# Altium footprint library con-samtec.PCBLIB: 805 footprints (part 16 of 55)
Each footprint in its own frame and in the unit in brackets; x right, y up, seen from the top. Pads: shape width x height; smd on the part's side, far side on the other; paste and mask are expansions set on the pad; w line width, h text height; cw(c..) or ccw(c..) is an arc to the next point about the centre after c.
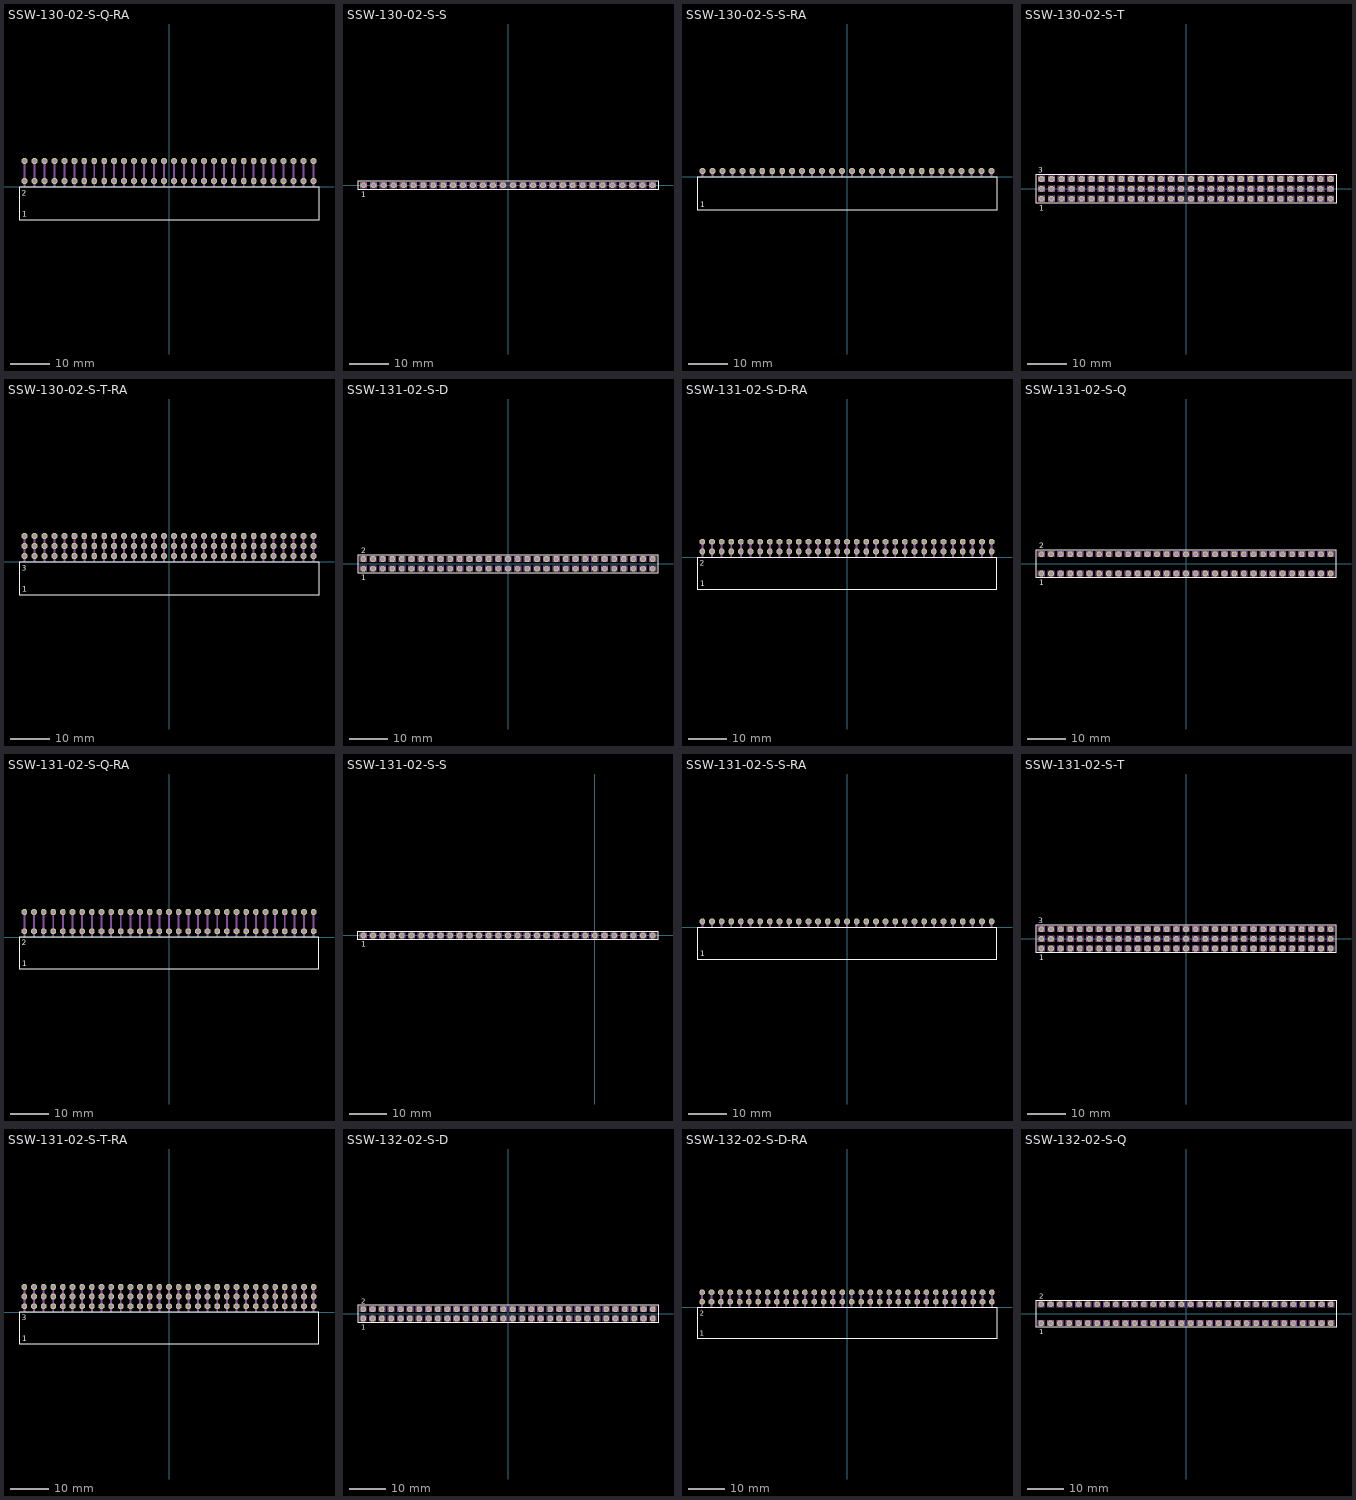
[diagram p15: the footprints below, top view; thin cyan lines are the x and y axes]

## SSW-130-02-S-Q-RA [mil]
pads (60):
  oct 59.06x59.06 hole 39.37: 1(-1450,60) 2(-1450,260) 3(-1350,60) 4(-1350,260) 5(-1250,60) 6(-1250,260) 7(-1150,60) 8(-1150,260) 9(-1050,60) 10(-1050,260) 11(-950,60) 12(-950,260) 13(-850,60) 14(-850,260) 15(-750,60) 16(-750,260) 17(-650,60) 18(-650,260) 19(-550,60) 20(-550,260) 21(-450,60) 22(-450,260) 23(-350,60) 24(-350,260) 25(-250,60) 26(-250,260) 27(-150,60) 28(-150,260) 29(-50,60) 30(-50,260) 31(50,60) 32(50,260) 33(150,60) 34(150,260) 35(250,60) 36(250,260) 37(350,60) 38(350,260) 39(450,60) 40(450,260) 41(550,60) 42(550,260) 43(650,60) 44(650,260) 45(750,60) 46(750,260) 47(850,60) 48(850,260) 49(950,60) 50(950,260) 51(1050,60) 52(1050,260) 53(1150,60) 54(1150,260) 55(1250,60) 56(1250,260) 57(1350,60) 58(1350,260) 59(1450,60) 60(1450,260)
Top Overlay:
  lines w8: -1505.08,-330.55 1505.08,-330.55 1505.08,-4.17 -1505.08,-4.17 -1505.08,-330.55
  text "1" at -1473.43,-301.18 h56.1
  text "2" at -1476.38,-86.61 h56.1
Mechanical 16:
  rectangle: -1460,0 -1440,270
  rectangle: -1360,0 -1340,270
  rectangle: -1260,0 -1240,270
  rectangle: -1160,0 -1140,270
  rectangle: -1060,0 -1040,270
  rectangle: -960,0 -940,270
  rectangle: -860,0 -840,270
  rectangle: -760,0 -740,270
  rectangle: -660,0 -640,270
  rectangle: -560,0 -540,270
  rectangle: -460,0 -440,270
  rectangle: -360,0 -340,270
  rectangle: -260,0 -240,270
  rectangle: -160,0 -140,270
  rectangle: -60,0 -40,270
  rectangle: 40,0 60,270
  rectangle: 140,0 160,270
  rectangle: 240,0 260,270
  rectangle: 340,0 360,270
  rectangle: 440,0 460,270
  rectangle: 540,0 560,270
  rectangle: 640,0 660,270
  rectangle: 740,0 760,270
  rectangle: 840,0 860,270
  rectangle: 940,0 960,270
  rectangle: 1040,0 1060,270
  rectangle: 1140,0 1160,270
  rectangle: 1240,0 1260,270
  rectangle: 1340,0 1360,270
  rectangle: 1440,0 1460,270

## SSW-130-02-S-S [mm]
pads (30):
  oct 1.5x1.5 hole 1: 1(-36.83,0) 2(-34.29,0) 3(-31.75,0) 4(-29.21,0) 5(-26.67,0) 6(-24.13,0) 7(-21.59,0) 8(-19.05,0) 9(-16.51,0) 10(-13.97,0) 11(-11.43,0) 12(-8.89,0) 13(-6.35,0) 14(-3.81,0) 15(-1.27,0) 16(1.27,0) 17(3.81,0) 18(6.35,0) 19(8.89,0) 20(11.43,0) 21(13.97,0) 22(16.51,0) 23(19.05,0) 24(21.59,0) 25(24.13,0) 26(26.67,0) 27(29.21,0) 28(31.75,0) 29(34.29,0) 30(36.83,0)
Top Overlay:
  lines w0.203: -38.229,-1.155 38.229,-1.155 38.229,1.155 -38.229,1.155 -38.229,-1.155
  text "1" at -37.338,-3.048 h1.42
Mechanical 16:
  lines w0.203: -37.575,-0.745 -36.075,-0.745 -36.075,0.755 -37.575,0.755 -37.575,-0.745 ; -35.035,-0.745 -33.535,-0.745 -33.535,0.755 -35.035,0.755 -35.035,-0.745 ; -32.495,-0.745 -30.995,-0.745 -30.995,0.755 -32.495,0.755 -32.495,-0.745 ; -29.955,-0.745 -28.455,-0.745 -28.455,0.755 -29.955,0.755 -29.955,-0.745 ; -27.415,-0.745 -25.915,-0.745 -25.915,0.755 -27.415,0.755 -27.415,-0.745 ; -24.875,-0.745 -23.375,-0.745 -23.375,0.755 -24.875,0.755 -24.875,-0.745 ; -22.335,-0.745 -20.835,-0.745 -20.835,0.755 -22.335,0.755 -22.335,-0.745 ; -19.795,-0.745 -18.295,-0.745 -18.295,0.755 -19.795,0.755 -19.795,-0.745 ; -17.255,-0.745 -15.755,-0.745 -15.755,0.755 -17.255,0.755 -17.255,-0.745 ; -14.715,-0.745 -13.215,-0.745 -13.215,0.755 -14.715,0.755 -14.715,-0.745 ; -12.175,-0.745 -10.675,-0.745 -10.675,0.755 -12.175,0.755 -12.175,-0.745 ; -9.635,-0.745 -8.135,-0.745 -8.135,0.755 -9.635,0.755 -9.635,-0.745 ; -7.095,-0.745 -5.595,-0.745 -5.595,0.755 -7.095,0.755 -7.095,-0.745 ; -4.555,-0.745 -3.055,-0.745 -3.055,0.755 -4.555,0.755 -4.555,-0.745 ; -2.015,-0.745 -0.515,-0.745 -0.515,0.755 -2.015,0.755 -2.015,-0.745 ; 0.525,-0.745 2.025,-0.745 2.025,0.755 0.525,0.755 0.525,-0.745 ; 3.065,-0.745 4.565,-0.745 4.565,0.755 3.065,0.755 3.065,-0.745 ; 5.605,-0.745 7.105,-0.745 7.105,0.755 5.605,0.755 5.605,-0.745 ; 8.145,-0.745 9.645,-0.745 9.645,0.755 8.145,0.755 8.145,-0.745 ; 10.685,-0.745 12.185,-0.745 12.185,0.755 10.685,0.755 10.685,-0.745 ; 13.225,-0.745 14.725,-0.745 14.725,0.755 13.225,0.755 13.225,-0.745 ; 15.765,-0.745 17.265,-0.745 17.265,0.755 15.765,0.755 15.765,-0.745 ; 18.305,-0.745 19.805,-0.745 19.805,0.755 18.305,0.755 18.305,-0.745 ; 20.845,-0.745 22.345,-0.745 22.345,0.755 20.845,0.755 20.845,-0.745 ; 23.385,-0.745 24.885,-0.745 24.885,0.755 23.385,0.755 23.385,-0.745 ; 25.925,-0.745 27.425,-0.745 27.425,0.755 25.925,0.755 25.925,-0.745 ; 28.465,-0.745 29.965,-0.745 29.965,0.755 28.465,0.755 28.465,-0.745 ; 31.005,-0.745 32.505,-0.745 32.505,0.755 31.005,0.755 31.005,-0.745 ; 33.545,-0.745 35.045,-0.745 35.045,0.755 33.545,0.755 33.545,-0.745 ; 36.085,-0.745 37.585,-0.745 37.585,0.755 36.085,0.755 36.085,-0.745

## SSW-130-02-S-S-RA [mil]
pads (30):
  oct 59.06x59.06 hole 39.37: 1(-1450,60) 2(-1350,60) 3(-1250,60) 4(-1150,60) 5(-1050,60) 6(-950,60) 7(-850,60) 8(-750,60) 9(-650,60) 10(-550,60) 11(-450,60) 12(-350,60) 13(-250,60) 14(-150,60) 15(-50,60) 16(50,60) 17(150,60) 18(250,60) 19(350,60) 20(450,60) 21(550,60) 22(650,60) 23(750,60) 24(850,60) 25(950,60) 26(1050,60) 27(1150,60) 28(1250,60) 29(1350,60) 30(1450,60)
Top Overlay:
  lines w8: -1505.08,-330.55 1505.08,-330.55 1505.08,-4.17 -1505.08,-4.17 -1505.08,-330.55
  text "1" at -1473.43,-301.18 h56.1
Mechanical 16:
  rectangle: -1460,0 -1440,70
  rectangle: -1360,0 -1340,70
  rectangle: -1260,0 -1240,70
  rectangle: -1160,0 -1140,70
  rectangle: -1060,0 -1040,70
  rectangle: -960,0 -940,70
  rectangle: -860,0 -840,70
  rectangle: -760,0 -740,70
  rectangle: -660,0 -640,70
  rectangle: -560,0 -540,70
  rectangle: -460,0 -440,70
  rectangle: -360,0 -340,70
  rectangle: -260,0 -240,70
  rectangle: -160,0 -140,70
  rectangle: -60,0 -40,70
  rectangle: 40,0 60,70
  rectangle: 140,0 160,70
  rectangle: 240,0 260,70
  rectangle: 340,0 360,70
  rectangle: 440,0 460,70
  rectangle: 540,0 560,70
  rectangle: 640,0 660,70
  rectangle: 740,0 760,70
  rectangle: 840,0 860,70
  rectangle: 940,0 960,70
  rectangle: 1040,0 1060,70
  rectangle: 1140,0 1160,70
  rectangle: 1240,0 1260,70
  rectangle: 1340,0 1360,70
  rectangle: 1440,0 1460,70

## SSW-130-02-S-T [mm]
pads (90):
  oct 1.5x1.5 hole 1: 1(-36.83,-2.54) 2(-36.83,0) 3(-36.83,2.54) 4(-34.29,-2.54) 5(-34.29,0) 6(-34.29,2.54) 7(-31.75,-2.54) 8(-31.75,0) 9(-31.75,2.54) 10(-29.21,-2.54) 11(-29.21,0) 12(-29.21,2.54) 13(-26.67,-2.54) 14(-26.67,0) 15(-26.67,2.54) 16(-24.13,-2.54) 17(-24.13,0) 18(-24.13,2.54) 19(-21.59,-2.54) 20(-21.59,0) 21(-21.59,2.54) 22(-19.05,-2.54) 23(-19.05,0) 24(-19.05,2.54) 25(-16.51,-2.54) 26(-16.51,0) 27(-16.51,2.54) 28(-13.97,-2.54) 29(-13.97,0) 30(-13.97,2.54) 31(-11.43,-2.54) 32(-11.43,0) 33(-11.43,2.54) 34(-8.89,-2.54) 35(-8.89,0) 36(-8.89,2.54) 37(-6.35,-2.54) 38(-6.35,0) 39(-6.35,2.54) 40(-3.81,-2.54) 41(-3.81,0) 42(-3.81,2.54) 43(-1.27,-2.54) 44(-1.27,0) 45(-1.27,2.54) 46(1.27,-2.54) 47(1.27,0) 48(1.27,2.54) 49(3.81,-2.54) 50(3.81,0) 51(3.81,2.54) 52(6.35,-2.54) 53(6.35,0) 54(6.35,2.54) 55(8.89,-2.54) 56(8.89,0) 57(8.89,2.54) 58(11.43,-2.54) 59(11.43,0) 60(11.43,2.54) 61(13.97,-2.54) 62(13.97,0) 63(13.97,2.54) 64(16.51,-2.54) 65(16.51,0) 66(16.51,2.54) 67(19.05,-2.54) 68(19.05,0) 69(19.05,2.54) 70(21.59,-2.54) 71(21.59,0) 72(21.59,2.54) 73(24.13,-2.54) 74(24.13,0) 75(24.13,2.54) 76(26.67,-2.54) 77(26.67,0) 78(26.67,2.54) 79(29.21,-2.54) 80(29.21,0) 81(29.21,2.54) 82(31.75,-2.54) 83(31.75,0) 84(31.75,2.54) 85(34.29,-2.54) 86(34.29,0) 87(34.29,2.54) 88(36.83,-2.54) 89(36.83,0) 90(36.83,2.54)
Top Overlay:
  lines w0.203: -38.229,-3.695 38.229,-3.695 38.229,3.695 -38.229,3.695 -38.229,-3.695
  text "1" at -37.338,-5.588 h1.42
  text "3" at -37.592,4.064 h1.42
Mechanical 16:
  drawing of 360 lines, arcs and shapes, not listed

## SSW-130-02-S-T-RA [mil]
pads (90):
  oct 59.06x59.06 hole 39.37: 1(-1450,60) 2(-1450,160) 3(-1450,260) 4(-1350,60) 5(-1350,160) 6(-1350,260) 7(-1250,60) 8(-1250,160) 9(-1250,260) 10(-1150,60) 11(-1150,160) 12(-1150,260) 13(-1050,60) 14(-1050,160) 15(-1050,260) 16(-950,60) 17(-950,160) 18(-950,260) 19(-850,60) 20(-850,160) 21(-850,260) 22(-750,60) 23(-750,160) 24(-750,260) 25(-650,60) 26(-650,160) 27(-650,260) 28(-550,60) 29(-550,160) 30(-550,260) 31(-450,60) 32(-450,160) 33(-450,260) 34(-350,60) 35(-350,160) 36(-350,260) 37(-250,60) 38(-250,160) 39(-250,260) 40(-150,60) 41(-150,160) 42(-150,260) 43(-50,60) 44(-50,160) 45(-50,260) 46(50,60) 47(50,160) 48(50,260) 49(150,60) 50(150,160) 51(150,260) 52(250,60) 53(250,160) 54(250,260) 55(350,60) 56(350,160) 57(350,260) 58(450,60) 59(450,160) 60(450,260) 61(550,60) 62(550,160) 63(550,260) 64(650,60) 65(650,160) 66(650,260) 67(750,60) 68(750,160) 69(750,260) 70(850,60) 71(850,160) 72(850,260) 73(950,60) 74(950,160) 75(950,260) 76(1050,60) 77(1050,160) 78(1050,260) 79(1150,60) 80(1150,160) 81(1150,260) 82(1250,60) 83(1250,160) 84(1250,260) 85(1350,60) 86(1350,160) 87(1350,260) 88(1450,60) 89(1450,160) 90(1450,260)
Top Overlay:
  lines w8: -1505.08,-330.55 1505.08,-330.55 1505.08,-4.17 -1505.08,-4.17 -1505.08,-330.55
  text "1" at -1473.43,-301.18 h56.1
  text "3" at -1476.38,-86.61 h56.1
Mechanical 16:
  rectangle: -1460,0 -1440,270
  rectangle: -1360,0 -1340,270
  rectangle: -1260,0 -1240,270
  rectangle: -1160,0 -1140,270
  rectangle: -1060,0 -1040,270
  rectangle: -960,0 -940,270
  rectangle: -860,0 -840,270
  rectangle: -760,0 -740,270
  rectangle: -660,0 -640,270
  rectangle: -560,0 -540,270
  rectangle: -460,0 -440,270
  rectangle: -360,0 -340,270
  rectangle: -260,0 -240,270
  rectangle: -160,0 -140,270
  rectangle: -60,0 -40,270
  rectangle: 40,0 60,270
  rectangle: 140,0 160,270
  rectangle: 240,0 260,270
  rectangle: 340,0 360,270
  rectangle: 440,0 460,270
  rectangle: 540,0 560,270
  rectangle: 640,0 660,270
  rectangle: 740,0 760,270
  rectangle: 840,0 860,270
  rectangle: 940,0 960,270
  rectangle: 1040,0 1060,270
  rectangle: 1140,0 1160,270
  rectangle: 1240,0 1260,270
  rectangle: 1340,0 1360,270
  rectangle: 1440,0 1460,270

## SSW-131-02-S-D [mm]
pads (62):
  oct 1.5x1.5 hole 1: 1(-38.1,-1.27) 2(-38.1,1.27) 3(-35.56,-1.27) 4(-35.56,1.27) 5(-33.02,-1.27) 6(-33.02,1.27) 7(-30.48,-1.27) 8(-30.48,1.27) 9(-27.94,-1.27) 10(-27.94,1.27) 11(-25.4,-1.27) 12(-25.4,1.27) 13(-22.86,-1.27) 14(-22.86,1.27) 15(-20.32,-1.27) 16(-20.32,1.27) 17(-17.78,-1.27) 18(-17.78,1.27) 19(-15.24,-1.27) 20(-15.24,1.27) 21(-12.7,-1.27) 22(-12.7,1.27) 23(-10.16,-1.27) 24(-10.16,1.27) 25(-7.62,-1.27) 26(-7.62,1.27) 27(-5.08,-1.27) 28(-5.08,1.27) 29(-2.54,-1.27) 30(-2.54,1.27) 31(0,-1.27) 32(0,1.27) 33(2.54,-1.27) 34(2.54,1.27) 35(5.08,-1.27) 36(5.08,1.27) 37(7.62,-1.27) 38(7.62,1.27) 39(10.16,-1.27) 40(10.16,1.27) 41(12.7,-1.27) 42(12.7,1.27) 43(15.24,-1.27) 44(15.24,1.27) 45(17.78,-1.27) 46(17.78,1.27) 47(20.32,-1.27) 48(20.32,1.27) 49(22.86,-1.27) 50(22.86,1.27) 51(25.4,-1.27) 52(25.4,1.27) 53(27.94,-1.27) 54(27.94,1.27) 55(30.48,-1.27) 56(30.48,1.27) 57(33.02,-1.27) 58(33.02,1.27) 59(35.56,-1.27) 60(35.56,1.27) 61(38.1,-1.27) 62(38.1,1.27)
Top Overlay:
  lines w0.203: -39.499,-2.425 39.499,-2.425 39.499,2.425 -39.499,2.425 -39.499,-2.425
  text "1" at -38.608,-4.318 h1.42
  text "2" at -38.608,2.794 h1.42
Mechanical 16:
  drawing of 248 lines, arcs and shapes, not listed

## SSW-131-02-S-D-RA [mil]
pads (62):
  oct 59.06x59.06 hole 39.37: 1(-1500,60) 2(-1500,160) 3(-1400,60) 4(-1400,160) 5(-1300,60) 6(-1300,160) 7(-1200,60) 8(-1200,160) 9(-1100,60) 10(-1100,160) 11(-1000,60) 12(-1000,160) 13(-900,60) 14(-900,160) 15(-800,60) 16(-800,160) 17(-700,60) 18(-700,160) 19(-600,60) 20(-600,160) 21(-500,60) 22(-500,160) 23(-400,60) 24(-400,160) 25(-300,60) 26(-300,160) 27(-200,60) 28(-200,160) 29(-100,60) 30(-100,160) 31(0,60) 32(0,160) 33(100,60) 34(100,160) 35(200,60) 36(200,160) 37(300,60) 38(300,160) 39(400,60) 40(400,160) 41(500,60) 42(500,160) 43(600,60) 44(600,160) 45(700,60) 46(700,160) 47(800,60) 48(800,160) 49(900,60) 50(900,160) 51(1000,60) 52(1000,160) 53(1100,60) 54(1100,160) 55(1200,60) 56(1200,160) 57(1300,60) 58(1300,160) 59(1400,60) 60(1400,160) 61(1500,60) 62(1500,160)
Top Overlay:
  lines w8: -1555.08,-330.55 1555.08,-330.55 1555.08,-4.17 -1555.08,-4.17 -1555.08,-330.55
  text "1" at -1523.43,-301.18 h56.1
  text "2" at -1526.38,-86.61 h56.1
Mechanical 16:
  rectangle: -1510,0 -1490,170
  rectangle: -1410,0 -1390,170
  rectangle: -1310,0 -1290,170
  rectangle: -1210,0 -1190,170
  rectangle: -1110,0 -1090,170
  rectangle: -1010,0 -990,170
  rectangle: -910,0 -890,170
  rectangle: -810,0 -790,170
  rectangle: -710,0 -690,170
  rectangle: -610,0 -590,170
  rectangle: -510,0 -490,170
  rectangle: -410,0 -390,170
  rectangle: -310,0 -290,170
  rectangle: -210,0 -190,170
  rectangle: -110,0 -90,170
  rectangle: -10,0 10,170
  rectangle: 90,0 110,170
  rectangle: 190,0 210,170
  rectangle: 290,0 310,170
  rectangle: 390,0 410,170
  rectangle: 490,0 510,170
  rectangle: 590,0 610,170
  rectangle: 690,0 710,170
  rectangle: 790,0 810,170
  rectangle: 890,0 910,170
  rectangle: 990,0 1010,170
  rectangle: 1090,0 1110,170
  rectangle: 1190,0 1210,170
  rectangle: 1290,0 1310,170
  rectangle: 1390,0 1410,170
  rectangle: 1490,0 1510,170

## SSW-131-02-S-Q [mm]
pads (62):
  oct 1.5x1.5 hole 1: 1(-38.1,-2.54) 2(-38.1,2.54) 3(-35.56,-2.54) 4(-35.56,2.54) 5(-33.02,-2.54) 6(-33.02,2.54) 7(-30.48,-2.54) 8(-30.48,2.54) 9(-27.94,-2.54) 10(-27.94,2.54) 11(-25.4,-2.54) 12(-25.4,2.54) 13(-22.86,-2.54) 14(-22.86,2.54) 15(-20.32,-2.54) 16(-20.32,2.54) 17(-17.78,-2.54) 18(-17.78,2.54) 19(-15.24,-2.54) 20(-15.24,2.54) 21(-12.7,-2.54) 22(-12.7,2.54) 23(-10.16,-2.54) 24(-10.16,2.54) 25(-7.62,-2.54) 26(-7.62,2.54) 27(-5.08,-2.54) 28(-5.08,2.54) 29(-2.54,-2.54) 30(-2.54,2.54) 31(0,-2.54) 32(0,2.54) 33(2.54,-2.54) 34(2.54,2.54) 35(5.08,-2.54) 36(5.08,2.54) 37(7.62,-2.54) 38(7.62,2.54) 39(10.16,-2.54) 40(10.16,2.54) 41(12.7,-2.54) 42(12.7,2.54) 43(15.24,-2.54) 44(15.24,2.54) 45(17.78,-2.54) 46(17.78,2.54) 47(20.32,-2.54) 48(20.32,2.54) 49(22.86,-2.54) 50(22.86,2.54) 51(25.4,-2.54) 52(25.4,2.54) 53(27.94,-2.54) 54(27.94,2.54) 55(30.48,-2.54) 56(30.48,2.54) 57(33.02,-2.54) 58(33.02,2.54) 59(35.56,-2.54) 60(35.56,2.54) 61(38.1,-2.54) 62(38.1,2.54)
Top Overlay:
  lines w0.203: -39.499,-3.695 39.499,-3.695 39.499,3.695 -39.499,3.695 -39.499,-3.695
  text "1" at -38.608,-5.588 h1.42
  text "2" at -38.608,4.064 h1.42
Mechanical 16:
  drawing of 248 lines, arcs and shapes, not listed

## SSW-131-02-S-Q-RA [mil]
pads (62):
  oct 59.06x59.06 hole 39.37: 1(-1500,60) 2(-1500,260) 3(-1400,60) 4(-1400,260) 5(-1300,60) 6(-1300,260) 7(-1200,60) 8(-1200,260) 9(-1100,60) 10(-1100,260) 11(-1000,60) 12(-1000,260) 13(-900,60) 14(-900,260) 15(-800,60) 16(-800,260) 17(-700,60) 18(-700,260) 19(-600,60) 20(-600,260) 21(-500,60) 22(-500,260) 23(-400,60) 24(-400,260) 25(-300,60) 26(-300,260) 27(-200,60) 28(-200,260) 29(-100,60) 30(-100,260) 31(0,60) 32(0,260) 33(100,60) 34(100,260) 35(200,60) 36(200,260) 37(300,60) 38(300,260) 39(400,60) 40(400,260) 41(500,60) 42(500,260) 43(600,60) 44(600,260) 45(700,60) 46(700,260) 47(800,60) 48(800,260) 49(900,60) 50(900,260) 51(1000,60) 52(1000,260) 53(1100,60) 54(1100,260) 55(1200,60) 56(1200,260) 57(1300,60) 58(1300,260) 59(1400,60) 60(1400,260) 61(1500,60) 62(1500,260)
Top Overlay:
  lines w8: -1555.08,-330.55 1555.08,-330.55 1555.08,-4.17 -1555.08,-4.17 -1555.08,-330.55
  text "1" at -1523.43,-301.18 h56.1
  text "2" at -1526.38,-86.61 h56.1
Mechanical 16:
  rectangle: -1510,0 -1490,270
  rectangle: -1410,0 -1390,270
  rectangle: -1310,0 -1290,270
  rectangle: -1210,0 -1190,270
  rectangle: -1110,0 -1090,270
  rectangle: -1010,0 -990,270
  rectangle: -910,0 -890,270
  rectangle: -810,0 -790,270
  rectangle: -710,0 -690,270
  rectangle: -610,0 -590,270
  rectangle: -510,0 -490,270
  rectangle: -410,0 -390,270
  rectangle: -310,0 -290,270
  rectangle: -210,0 -190,270
  rectangle: -110,0 -90,270
  rectangle: -10,0 10,270
  rectangle: 90,0 110,270
  rectangle: 190,0 210,270
  rectangle: 290,0 310,270
  rectangle: 390,0 410,270
  rectangle: 490,0 510,270
  rectangle: 590,0 610,270
  rectangle: 690,0 710,270
  rectangle: 790,0 810,270
  rectangle: 890,0 910,270
  rectangle: 990,0 1010,270
  rectangle: 1090,0 1110,270
  rectangle: 1190,0 1210,270
  rectangle: 1290,0 1310,270
  rectangle: 1390,0 1410,270
  rectangle: 1490,0 1510,270

## SSW-131-02-S-S [mm]
pads (31):
  oct 1.5x1.5 hole 1: 1(-60.96,0) 2(-58.42,0) 3(-55.88,0) 4(-53.34,0) 5(-50.8,0) 6(-48.26,0) 7(-45.72,0) 8(-43.18,0) 9(-40.64,0) 10(-38.1,0) 11(-35.56,0) 12(-33.02,0) 13(-30.48,0) 14(-27.94,0) 15(-25.4,0) 16(-22.86,0) 17(-20.32,0) 18(-17.78,0) 19(-15.24,0) 20(-12.7,0) 21(-10.16,0) 22(-7.62,0) 23(-5.08,0) 24(-2.54,0) 25(0,0) 26(2.54,0) 27(5.08,0) 28(7.62,0) 29(10.16,0) 30(12.7,0) 31(15.24,0)
Top Overlay:
  lines w0.203: -62.359,-1.155 16.639,-1.155 16.639,1.155 -62.359,1.155 -62.359,-1.155
  text "1" at -61.468,-3.048 h1.42
Mechanical 16:
  lines w0.203: -61.705,-0.745 -60.205,-0.745 -60.205,0.755 -61.705,0.755 -61.705,-0.745 ; -59.165,-0.745 -57.665,-0.745 -57.665,0.755 -59.165,0.755 -59.165,-0.745 ; -56.625,-0.745 -55.125,-0.745 -55.125,0.755 -56.625,0.755 -56.625,-0.745 ; -54.085,-0.745 -52.585,-0.745 -52.585,0.755 -54.085,0.755 -54.085,-0.745 ; -51.545,-0.745 -50.045,-0.745 -50.045,0.755 -51.545,0.755 -51.545,-0.745 ; -49.005,-0.745 -47.505,-0.745 -47.505,0.755 -49.005,0.755 -49.005,-0.745 ; -46.465,-0.745 -44.965,-0.745 -44.965,0.755 -46.465,0.755 -46.465,-0.745 ; -43.925,-0.745 -42.425,-0.745 -42.425,0.755 -43.925,0.755 -43.925,-0.745 ; -41.385,-0.745 -39.885,-0.745 -39.885,0.755 -41.385,0.755 -41.385,-0.745 ; -38.845,-0.745 -37.345,-0.745 -37.345,0.755 -38.845,0.755 -38.845,-0.745 ; -36.305,-0.745 -34.805,-0.745 -34.805,0.755 -36.305,0.755 -36.305,-0.745 ; -33.765,-0.745 -32.265,-0.745 -32.265,0.755 -33.765,0.755 -33.765,-0.745 ; -31.225,-0.745 -29.725,-0.745 -29.725,0.755 -31.225,0.755 -31.225,-0.745 ; -28.685,-0.745 -27.185,-0.745 -27.185,0.755 -28.685,0.755 -28.685,-0.745 ; -26.145,-0.745 -24.645,-0.745 -24.645,0.755 -26.145,0.755 -26.145,-0.745 ; -23.605,-0.745 -22.105,-0.745 -22.105,0.755 -23.605,0.755 -23.605,-0.745 ; -21.065,-0.745 -19.565,-0.745 -19.565,0.755 -21.065,0.755 -21.065,-0.745 ; -18.525,-0.745 -17.025,-0.745 -17.025,0.755 -18.525,0.755 -18.525,-0.745 ; -15.985,-0.745 -14.485,-0.745 -14.485,0.755 -15.985,0.755 -15.985,-0.745 ; -13.445,-0.745 -11.945,-0.745 -11.945,0.755 -13.445,0.755 -13.445,-0.745 ; -10.905,-0.745 -9.405,-0.745 -9.405,0.755 -10.905,0.755 -10.905,-0.745 ; -8.365,-0.745 -6.865,-0.745 -6.865,0.755 -8.365,0.755 -8.365,-0.745 ; -5.825,-0.745 -4.325,-0.745 -4.325,0.755 -5.825,0.755 -5.825,-0.745 ; -3.285,-0.745 -1.785,-0.745 -1.785,0.755 -3.285,0.755 -3.285,-0.745 ; -0.745,-0.745 0.755,-0.745 0.755,0.755 -0.745,0.755 -0.745,-0.745 ; 1.795,-0.745 3.295,-0.745 3.295,0.755 1.795,0.755 1.795,-0.745 ; 4.335,-0.745 5.835,-0.745 5.835,0.755 4.335,0.755 4.335,-0.745 ; 6.875,-0.745 8.375,-0.745 8.375,0.755 6.875,0.755 6.875,-0.745 ; 9.415,-0.745 10.915,-0.745 10.915,0.755 9.415,0.755 9.415,-0.745 ; 11.955,-0.745 13.455,-0.745 13.455,0.755 11.955,0.755 11.955,-0.745 ; 14.495,-0.745 15.995,-0.745 15.995,0.755 14.495,0.755 14.495,-0.745

## SSW-131-02-S-S-RA [mil]
pads (31):
  oct 59.06x59.06 hole 39.37: 1(-1500,60) 2(-1400,60) 3(-1300,60) 4(-1200,60) 5(-1100,60) 6(-1000,60) 7(-900,60) 8(-800,60) 9(-700,60) 10(-600,60) 11(-500,60) 12(-400,60) 13(-300,60) 14(-200,60) 15(-100,60) 16(0,60) 17(100,60) 18(200,60) 19(300,60) 20(400,60) 21(500,60) 22(600,60) 23(700,60) 24(800,60) 25(900,60) 26(1000,60) 27(1100,60) 28(1200,60) 29(1300,60) 30(1400,60) 31(1500,60)
Top Overlay:
  lines w8: -1555.08,-330.55 1555.08,-330.55 1555.08,-4.17 -1555.08,-4.17 -1555.08,-330.55
  text "1" at -1523.43,-301.18 h56.1
Mechanical 16:
  rectangle: -1510,0 -1490,70
  rectangle: -1410,0 -1390,70
  rectangle: -1310,0 -1290,70
  rectangle: -1210,0 -1190,70
  rectangle: -1110,0 -1090,70
  rectangle: -1010,0 -990,70
  rectangle: -910,0 -890,70
  rectangle: -810,0 -790,70
  rectangle: -710,0 -690,70
  rectangle: -610,0 -590,70
  rectangle: -510,0 -490,70
  rectangle: -410,0 -390,70
  rectangle: -310,0 -290,70
  rectangle: -210,0 -190,70
  rectangle: -110,0 -90,70
  rectangle: -10,0 10,70
  rectangle: 90,0 110,70
  rectangle: 190,0 210,70
  rectangle: 290,0 310,70
  rectangle: 390,0 410,70
  rectangle: 490,0 510,70
  rectangle: 590,0 610,70
  rectangle: 690,0 710,70
  rectangle: 790,0 810,70
  rectangle: 890,0 910,70
  rectangle: 990,0 1010,70
  rectangle: 1090,0 1110,70
  rectangle: 1190,0 1210,70
  rectangle: 1290,0 1310,70
  rectangle: 1390,0 1410,70
  rectangle: 1490,0 1510,70

## SSW-131-02-S-T [mm]
pads (93):
  oct 1.5x1.5 hole 1: 1(-38.1,-2.54) 2(-38.1,0) 3(-38.1,2.54) 4(-35.56,-2.54) 5(-35.56,0) 6(-35.56,2.54) 7(-33.02,-2.54) 8(-33.02,0) 9(-33.02,2.54) 10(-30.48,-2.54) 11(-30.48,0) 12(-30.48,2.54) 13(-27.94,-2.54) 14(-27.94,0) 15(-27.94,2.54) 16(-25.4,-2.54) 17(-25.4,0) 18(-25.4,2.54) 19(-22.86,-2.54) 20(-22.86,0) 21(-22.86,2.54) 22(-20.32,-2.54) 23(-20.32,0) 24(-20.32,2.54) 25(-17.78,-2.54) 26(-17.78,0) 27(-17.78,2.54) 28(-15.24,-2.54) 29(-15.24,0) 30(-15.24,2.54) 31(-12.7,-2.54) 32(-12.7,0) 33(-12.7,2.54) 34(-10.16,-2.54) 35(-10.16,0) 36(-10.16,2.54) 37(-7.62,-2.54) 38(-7.62,0) 39(-7.62,2.54) 40(-5.08,-2.54) 41(-5.08,0) 42(-5.08,2.54) 43(-2.54,-2.54) 44(-2.54,0) 45(-2.54,2.54) 46(0,-2.54) 47(0,0) 48(0,2.54) 49(2.54,-2.54) 50(2.54,0) 51(2.54,2.54) 52(5.08,-2.54) 53(5.08,0) 54(5.08,2.54) 55(7.62,-2.54) 56(7.62,0) 57(7.62,2.54) 58(10.16,-2.54) 59(10.16,0) 60(10.16,2.54) 61(12.7,-2.54) 62(12.7,0) 63(12.7,2.54) 64(15.24,-2.54) 65(15.24,0) 66(15.24,2.54) 67(17.78,-2.54) 68(17.78,0) 69(17.78,2.54) 70(20.32,-2.54) 71(20.32,0) 72(20.32,2.54) 73(22.86,-2.54) 74(22.86,0) 75(22.86,2.54) 76(25.4,-2.54) 77(25.4,0) 78(25.4,2.54) 79(27.94,-2.54) 80(27.94,0) 81(27.94,2.54) 82(30.48,-2.54) 83(30.48,0) 84(30.48,2.54) 85(33.02,-2.54) 86(33.02,0) 87(33.02,2.54) 88(35.56,-2.54) 89(35.56,0) 90(35.56,2.54) 91(38.1,-2.54) 92(38.1,0) 93(38.1,2.54)
Top Overlay:
  lines w0.203: -39.499,-3.695 39.499,-3.695 39.499,3.695 -39.499,3.695 -39.499,-3.695
  text "1" at -38.608,-5.588 h1.42
  text "3" at -38.862,4.064 h1.42
Mechanical 16:
  drawing of 372 lines, arcs and shapes, not listed

## SSW-131-02-S-T-RA [mil]
pads (93):
  oct 59.06x59.06 hole 39.37: 1(-1500,60) 2(-1500,160) 3(-1500,260) 4(-1400,60) 5(-1400,160) 6(-1400,260) 7(-1300,60) 8(-1300,160) 9(-1300,260) 10(-1200,60) 11(-1200,160) 12(-1200,260) 13(-1100,60) 14(-1100,160) 15(-1100,260) 16(-1000,60) 17(-1000,160) 18(-1000,260) 19(-900,60) 20(-900,160) 21(-900,260) 22(-800,60) 23(-800,160) 24(-800,260) 25(-700,60) 26(-700,160) 27(-700,260) 28(-600,60) 29(-600,160) 30(-600,260) 31(-500,60) 32(-500,160) 33(-500,260) 34(-400,60) 35(-400,160) 36(-400,260) 37(-300,60) 38(-300,160) 39(-300,260) 40(-200,60) 41(-200,160) 42(-200,260) 43(-100,60) 44(-100,160) 45(-100,260) 46(0,60) 47(0,160) 48(0,260) 49(100,60) 50(100,160) 51(100,260) 52(200,60) 53(200,160) 54(200,260) 55(300,60) 56(300,160) 57(300,260) 58(400,60) 59(400,160) 60(400,260) 61(500,60) 62(500,160) 63(500,260) 64(600,60) 65(600,160) 66(600,260) 67(700,60) 68(700,160) 69(700,260) 70(800,60) 71(800,160) 72(800,260) 73(900,60) 74(900,160) 75(900,260) 76(1000,60) 77(1000,160) 78(1000,260) 79(1100,60) 80(1100,160) 81(1100,260) 82(1200,60) 83(1200,160) 84(1200,260) 85(1300,60) 86(1300,160) 87(1300,260) 88(1400,60) 89(1400,160) 90(1400,260) 91(1500,60) 92(1500,160) 93(1500,260)
Top Overlay:
  lines w8: -1555.08,-330.55 1555.08,-330.55 1555.08,-4.17 -1555.08,-4.17 -1555.08,-330.55
  text "1" at -1523.43,-301.18 h56.1
  text "3" at -1526.38,-86.61 h56.1
Mechanical 16:
  rectangle: -1510,0 -1490,270
  rectangle: -1410,0 -1390,270
  rectangle: -1310,0 -1290,270
  rectangle: -1210,0 -1190,270
  rectangle: -1110,0 -1090,270
  rectangle: -1010,0 -990,270
  rectangle: -910,0 -890,270
  rectangle: -810,0 -790,270
  rectangle: -710,0 -690,270
  rectangle: -610,0 -590,270
  rectangle: -510,0 -490,270
  rectangle: -410,0 -390,270
  rectangle: -310,0 -290,270
  rectangle: -210,0 -190,270
  rectangle: -110,0 -90,270
  rectangle: -10,0 10,270
  rectangle: 90,0 110,270
  rectangle: 190,0 210,270
  rectangle: 290,0 310,270
  rectangle: 390,0 410,270
  rectangle: 490,0 510,270
  rectangle: 590,0 610,270
  rectangle: 690,0 710,270
  rectangle: 790,0 810,270
  rectangle: 890,0 910,270
  rectangle: 990,0 1010,270
  rectangle: 1090,0 1110,270
  rectangle: 1190,0 1210,270
  rectangle: 1290,0 1310,270
  rectangle: 1390,0 1410,270
  rectangle: 1490,0 1510,270

## SSW-132-02-S-D [mm]
pads (64):
  oct 1.5x1.5 hole 1: 1(-39.37,-1.27) 2(-39.37,1.27) 3(-36.83,-1.27) 4(-36.83,1.27) 5(-34.29,-1.27) 6(-34.29,1.27) 7(-31.75,-1.27) 8(-31.75,1.27) 9(-29.21,-1.27) 10(-29.21,1.27) 11(-26.67,-1.27) 12(-26.67,1.27) 13(-24.13,-1.27) 14(-24.13,1.27) 15(-21.59,-1.27) 16(-21.59,1.27) 17(-19.05,-1.27) 18(-19.05,1.27) 19(-16.51,-1.27) 20(-16.51,1.27) 21(-13.97,-1.27) 22(-13.97,1.27) 23(-11.43,-1.27) 24(-11.43,1.27) 25(-8.89,-1.27) 26(-8.89,1.27) 27(-6.35,-1.27) 28(-6.35,1.27) 29(-3.81,-1.27) 30(-3.81,1.27) 31(-1.27,-1.27) 32(-1.27,1.27) 33(1.27,-1.27) 34(1.27,1.27) 35(3.81,-1.27) 36(3.81,1.27) 37(6.35,-1.27) 38(6.35,1.27) 39(8.89,-1.27) 40(8.89,1.27) 41(11.43,-1.27) 42(11.43,1.27) 43(13.97,-1.27) 44(13.97,1.27) 45(16.51,-1.27) 46(16.51,1.27) 47(19.05,-1.27) 48(19.05,1.27) 49(21.59,-1.27) 50(21.59,1.27) 51(24.13,-1.27) 52(24.13,1.27) 53(26.67,-1.27) 54(26.67,1.27) 55(29.21,-1.27) 56(29.21,1.27) 57(31.75,-1.27) 58(31.75,1.27) 59(34.29,-1.27) 60(34.29,1.27) 61(36.83,-1.27) 62(36.83,1.27) 63(39.37,-1.27) 64(39.37,1.27)
Top Overlay:
  lines w0.203: -40.769,-2.425 40.769,-2.425 40.769,2.425 -40.769,2.425 -40.769,-2.425
  text "1" at -39.878,-4.318 h1.42
  text "2" at -39.878,2.794 h1.42
Mechanical 16:
  drawing of 256 lines, arcs and shapes, not listed

## SSW-132-02-S-D-RA [mil]
pads (64):
  oct 59.06x59.06 hole 39.37: 1(-1550,60) 2(-1550,160) 3(-1450,60) 4(-1450,160) 5(-1350,60) 6(-1350,160) 7(-1250,60) 8(-1250,160) 9(-1150,60) 10(-1150,160) 11(-1050,60) 12(-1050,160) 13(-950,60) 14(-950,160) 15(-850,60) 16(-850,160) 17(-750,60) 18(-750,160) 19(-650,60) 20(-650,160) 21(-550,60) 22(-550,160) 23(-450,60) 24(-450,160) 25(-350,60) 26(-350,160) 27(-250,60) 28(-250,160) 29(-150,60) 30(-150,160) 31(-50,60) 32(-50,160) 33(50,60) 34(50,160) 35(150,60) 36(150,160) 37(250,60) 38(250,160) 39(350,60) 40(350,160) 41(450,60) 42(450,160) 43(550,60) 44(550,160) 45(650,60) 46(650,160) 47(750,60) 48(750,160) 49(850,60) 50(850,160) 51(950,60) 52(950,160) 53(1050,60) 54(1050,160) 55(1150,60) 56(1150,160) 57(1250,60) 58(1250,160) 59(1350,60) 60(1350,160) 61(1450,60) 62(1450,160) 63(1550,60) 64(1550,160)
Top Overlay:
  lines w8: -1605.08,-330.55 1605.08,-330.55 1605.08,-4.17 -1605.08,-4.17 -1605.08,-330.55
  text "1" at -1573.43,-301.18 h56.1
  text "2" at -1576.38,-86.61 h56.1
Mechanical 16:
  rectangle: -1560,0 -1540,170
  rectangle: -1460,0 -1440,170
  rectangle: -1360,0 -1340,170
  rectangle: -1260,0 -1240,170
  rectangle: -1160,0 -1140,170
  rectangle: -1060,0 -1040,170
  rectangle: -960,0 -940,170
  rectangle: -860,0 -840,170
  rectangle: -760,0 -740,170
  rectangle: -660,0 -640,170
  rectangle: -560,0 -540,170
  rectangle: -460,0 -440,170
  rectangle: -360,0 -340,170
  rectangle: -260,0 -240,170
  rectangle: -160,0 -140,170
  rectangle: -60,0 -40,170
  rectangle: 40,0 60,170
  rectangle: 140,0 160,170
  rectangle: 240,0 260,170
  rectangle: 340,0 360,170
  rectangle: 440,0 460,170
  rectangle: 540,0 560,170
  rectangle: 640,0 660,170
  rectangle: 740,0 760,170
  rectangle: 840,0 860,170
  rectangle: 940,0 960,170
  rectangle: 1040,0 1060,170
  rectangle: 1140,0 1160,170
  rectangle: 1240,0 1260,170
  rectangle: 1340,0 1360,170
  rectangle: 1440,0 1460,170
  rectangle: 1540,0 1560,170

## SSW-132-02-S-Q [mm]
pads (64):
  oct 1.5x1.5 hole 1: 1(-39.37,-2.54) 2(-39.37,2.54) 3(-36.83,-2.54) 4(-36.83,2.54) 5(-34.29,-2.54) 6(-34.29,2.54) 7(-31.75,-2.54) 8(-31.75,2.54) 9(-29.21,-2.54) 10(-29.21,2.54) 11(-26.67,-2.54) 12(-26.67,2.54) 13(-24.13,-2.54) 14(-24.13,2.54) 15(-21.59,-2.54) 16(-21.59,2.54) 17(-19.05,-2.54) 18(-19.05,2.54) 19(-16.51,-2.54) 20(-16.51,2.54) 21(-13.97,-2.54) 22(-13.97,2.54) 23(-11.43,-2.54) 24(-11.43,2.54) 25(-8.89,-2.54) 26(-8.89,2.54) 27(-6.35,-2.54) 28(-6.35,2.54) 29(-3.81,-2.54) 30(-3.81,2.54) 31(-1.27,-2.54) 32(-1.27,2.54) 33(1.27,-2.54) 34(1.27,2.54) 35(3.81,-2.54) 36(3.81,2.54) 37(6.35,-2.54) 38(6.35,2.54) 39(8.89,-2.54) 40(8.89,2.54) 41(11.43,-2.54) 42(11.43,2.54) 43(13.97,-2.54) 44(13.97,2.54) 45(16.51,-2.54) 46(16.51,2.54) 47(19.05,-2.54) 48(19.05,2.54) 49(21.59,-2.54) 50(21.59,2.54) 51(24.13,-2.54) 52(24.13,2.54) 53(26.67,-2.54) 54(26.67,2.54) 55(29.21,-2.54) 56(29.21,2.54) 57(31.75,-2.54) 58(31.75,2.54) 59(34.29,-2.54) 60(34.29,2.54) 61(36.83,-2.54) 62(36.83,2.54) 63(39.37,-2.54) 64(39.37,2.54)
Top Overlay:
  lines w0.203: -40.769,-3.695 40.769,-3.695 40.769,3.695 -40.769,3.695 -40.769,-3.695
  text "1" at -39.878,-5.588 h1.42
  text "2" at -39.878,4.064 h1.42
Mechanical 16:
  drawing of 256 lines, arcs and shapes, not listed